# Altium footprint library RPSLib_orignal.PcbLib: 199 footprints (part 13 of 13)
Each footprint in its own frame and in the unit in brackets; x right, y up, seen from the top. Pads: shape width x height; smd on the part's side, far side on the other; paste and mask are expansions set on the pad; w line width, h text height; cw(c..) or ccw(c..) is an arc to the next point about the centre after c.
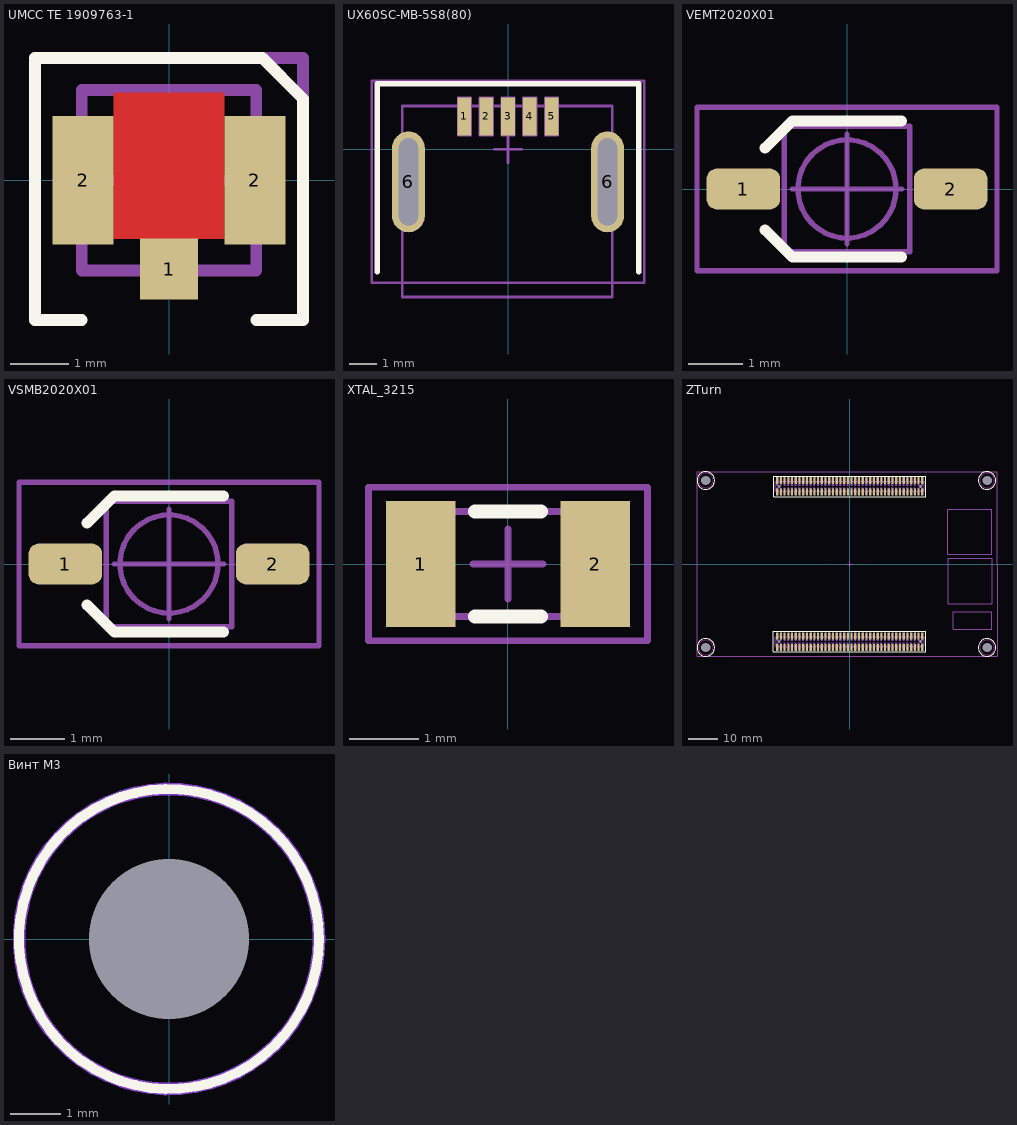
[diagram p12: the footprints below, top view; thin cyan lines are the x and y axes]

## UMCC TE 1909763-1 [mm]
height 1.25
pads (3):
  rect 1x1.05 smd mask+0.07: 1(0,-1.525)
  rect 1.05x2.2 smd mask+0.07: 2(-1.475,0) 2(1.475,0)
Top Layer:
  pour cut-out: -0.95,-1 -0.95,1.5 0.95,1.5 0.95,-1
Top Overlay:
  lines w0.2: -1.5,-2.4 -2.3,-2.4 -2.3,2.1 1.6,2.1 2.3,1.4 2.3,-2.4 1.5,-2.4
Mechanical 13:
  lines w0.2: -1.5,-1.55 -1.5,1.55 1.5,1.55 1.5,-1.55 -1.5,-1.55
Mechanical 15:
  lines w0.2: -2.3,-2.4 -2.3,2.1 2.3,2.1 2.3,-2.4 ; -1,0 1,0 ; 0,-1 0,1
3D body "С-1909763-1.stp": height 1.23, standoff 0, extent -1.5,-1.55 1.5,1.55

## UX60SC-MB-5S8(80) [mm]
height 4
pads (7):
  rect 0.5x1.4 smd mask+0.07: 1(-1.6,1.2) 2(-0.8,1.2) 3(0,1.2) 4(0.8,1.2) 5(1.6,1.2)
  oval 1.2x3.7 hole 0.7 slot 3.2 at 90 deg mask+0.07: 6(-3.65,-1.2) 6(3.65,-1.2)
Top Overlay:
  lines w0.2: -4.8,-4.5 -4.8,2.4 4.8,2.4 4.8,-4.5
Mechanical 1:
  lines w0.05: -3.897,-2.697 -3.403,0.297 ; -3.897,0.297 -3.403,-2.697 ; 3.403,-2.697 3.897,0.297 ; 3.403,0.297 3.897,-2.697 ; -1.85,0.5 -1.35,0.5 ; -1.85,0.5 -1.85,1.9 ; -1.85,0.5 -1.35,1.9 ; -1.85,1.9 -1.35,1.9 ; -1.85,1.9 -1.35,0.5 ; -1.35,0.5 -1.35,1.9 ; -1.05,0.5 -0.55,0.5 ; -1.05,0.5 -1.05,1.9 ; -1.05,0.5 -0.55,1.9 ; -1.05,1.9 -0.55,1.9 ; -1.05,1.9 -0.55,0.5 ; -0.55,0.5 -0.55,1.9 ; -0.25,0.5 0.25,0.5 ; -0.25,0.5 -0.25,1.9 ; -0.25,0.5 0.25,1.9 ; -0.25,1.9 0.25,1.9 ; -0.25,1.9 0.25,0.5 ; 0.25,0.5 0.25,1.9 ; 0.55,0.5 1.05,0.5 ; 0.55,0.5 0.55,1.9 ; 0.55,0.5 1.05,1.9 ; 0.55,1.9 1.05,1.9 ; 0.55,1.9 1.05,0.5 ; 1.05,0.5 1.05,1.9 ; 1.35,0.5 1.85,0.5 ; 1.35,0.5 1.35,1.9 ; 1.35,0.5 1.85,1.9 ; 1.35,1.9 1.85,1.9 ; 1.35,1.9 1.85,0.5 ; 1.85,0.5 1.85,1.9 ; -4,-2.45 ccw(c-3.65,-2.45) -3.65,-2.8 ccw(c-3.65,-2.45) -3.3,-2.45 -3.3,0.05 ccw(c-3.65,0.05) -3.65,0.4 ccw(c-3.65,0.05) -4,0.05 -4,-2.45 ; 3.3,-2.45 ccw(c3.65,-2.45) 3.65,-2.8 ccw(c3.65,-2.45) 4,-2.45 4,0.05 ccw(c3.65,0.05) 3.65,0.4 ccw(c3.65,0.05) 3.3,0.05 3.3,-2.45
Mechanical 13:
  lines w0.1: -3.875,-5.421 3.825,-5.421 3.825,1.579 -3.875,1.579 -3.875,-5.421
Mechanical 15:
  lines w0.1: -0.5,0 0.5,0 ; 0,-0.5 0,0.5 ; -5,-4.9 5,-4.9 5,2.5 -5,2.5 -5,-4.9
3D body "UX60SC-MB-5S8.stp": height 3.9, standoff -0.8, extent -3.875,-5.421 3.825,1.579

## VEMT2020X01 [mm] "Phototransistor 2.3x2.3, 2.8 height"
height 2.8
pads (2):
  rrect50% 1.35x0.75 smd mask+0.07: 1(-1.9,0) 2(1.9,0)
Top Overlay:
  lines w0.2: -1.5,-0.75 -1,-1.25 1,-1.25 ; -1.5,0.75 -1,1.25 1,1.25
Mechanical 13:
  circle w0.1: c0,0 r0.9
  lines w0.1: -1.15,-1.15 1.15,-1.15 1.15,1.15 -1.15,1.15 -1.15,-1.15
Mechanical 15:
  lines w0.1: -1,0 1,0 ; 0,-1 0,1 ; -2.75,-1.5 -2.75,1.5 2.75,1.5 2.75,-1.5 -2.75,-1.5
3D body "VEMT2020X01.step": height 2.77, standoff 0.05, extent -2.1,-1.15 2.1,1.15

## VSMB2020X01 [mm] "IR LED 2.3x2.3, 2.8 height"
height 2.8
pads (2):
  rrect50% 1.35x0.75 smd mask+0.07: 1(-1.9,0) 2(1.9,0)
Top Overlay:
  lines w0.2: -1.5,-0.75 -1,-1.25 1,-1.25 ; -1.5,0.75 -1,1.25 1,1.25
Mechanical 13:
  circle w0.1: c0,0 r0.9
  lines w0.1: -1.15,-1.15 -1.15,1.15 1.15,1.15 1.15,-1.15 -1.15,-1.15
Mechanical 15:
  lines w0.1: -1,0 1,0 ; 0,-1 0,1 ; -2.75,-1.5 2.75,-1.5 2.75,1.5 -2.75,1.5 -2.75,-1.5
3D body "VEMT2020X01.step": height 2.77, standoff 0.05, extent -2.1,-1.15 2.1,1.15

## XTAL_3215 [mm]
pads (2):
  rect 1x1.8 smd: 1(-1.25,0) 2(1.25,0)
Top Overlay:
  lines w0.2: -0.475,-0.75 0.475,-0.75 ; -0.475,0.75 0.475,0.75
Mechanical 3:
  lines w0.1: -1.6,-0.55 cw(c-1.6,-0.75) -1.4,-0.75 1.4,-0.75 cw(c1.6,-0.75) 1.6,-0.55 1.6,0.55 cw(c1.6,0.75) 1.4,0.75 -1.4,0.75 cw(c-1.6,0.75) -1.6,0.55 -1.6,-0.55
Mechanical 15:
  lines w0.1: -0.5,0 0.5,0 ; 0,-0.5 0,0.5 ; -2,-1.1 2,-1.1 2,1.1 -2,1.1 -2,-1.1
3D body "User Library-Siward_SX3215.step": height 0.81, standoff 0, extent -1.6,-0.75 1.6,0.75
3D body: height 0.81, standoff 0.15, extent -1.2,-0.6 1.2,0.6

## ZTurn [mm]
pads (168):
  rect 0.75x2.4 smd mask+0.07: A1(-24.765,-24.55) A2(-24.765,-28.45) A3(-23.495,-24.55) A4(-23.495,-28.45) A5(-22.225,-24.55) A6(-22.225,-28.45) A7(-20.955,-24.55) A8(-20.955,-28.45) A9(-19.685,-24.55) A10(-19.685,-28.45) A11(-18.415,-24.55) A12(-18.415,-28.45) A13(-17.145,-24.55) A14(-17.145,-28.45) A15(-15.875,-24.55) A16(-15.875,-28.45) A17(-14.605,-24.55) A18(-14.605,-28.45) A19(-13.335,-24.55) A20(-13.335,-28.45) A21(-12.065,-24.55) A22(-12.065,-28.45) A23(-10.795,-24.55) A24(-10.795,-28.45) A25(-9.525,-24.55) A26(-9.525,-28.45) A27(-8.255,-24.55) A28(-8.255,-28.45) A29(-6.985,-24.55) A30(-6.985,-28.45) A31(-5.715,-24.55) A32(-5.715,-28.45) A33(-4.445,-24.55) A34(-4.445,-28.45) A35(-3.175,-24.55) A36(-3.175,-28.45) A37(-1.905,-24.55) A38(-1.905,-28.45) A39(-0.635,-24.55) A40(-0.635,-28.45) A41(0.635,-24.55) A42(0.635,-28.45) A43(1.905,-24.55) A44(1.905,-28.45) A45(3.175,-24.55) A46(3.175,-28.45) A47(4.445,-24.55) A48(4.445,-28.45) A49(5.715,-24.55) A50(5.715,-28.45) A51(6.985,-24.55) A52(6.985,-28.45) A53(8.255,-24.55) A54(8.255,-28.45) A55(9.525,-24.55) A56(9.525,-28.45) A57(10.795,-24.55) A58(10.795,-28.45) A59(12.065,-24.55) A60(12.065,-28.45) A61(13.335,-24.55) A62(13.335,-28.45) A63(14.605,-24.55) A64(14.605,-28.45) A65(15.875,-24.55) A66(15.875,-28.45) A67(17.145,-24.55) A68(17.145,-28.45) A69(18.415,-24.55) A70(18.415,-28.45) A71(19.685,-24.55) A72(19.685,-28.45) A73(20.955,-24.55) A74(20.955,-28.45) A75(22.225,-24.55) A76(22.225,-28.45) A77(23.495,-24.55) A78(23.495,-28.45) A79(24.765,-24.55) A80(24.765,-28.45) B1(-24.765,28.45) B2(-24.765,24.55) B3(-23.495,28.45) B4(-23.495,24.55) B5(-22.225,28.45) B6(-22.225,24.55) B7(-20.955,28.45) B8(-20.955,24.55) B9(-19.685,28.45) B10(-19.685,24.55) B11(-18.415,28.45) B12(-18.415,24.55) B13(-17.145,28.45) B14(-17.145,24.55) B15(-15.875,28.45) B16(-15.875,24.55) B17(-14.605,28.45) B18(-14.605,24.55) B19(-13.335,28.45) B20(-13.335,24.55) B21(-12.065,28.45) B22(-12.065,24.55) B23(-10.795,28.45) B24(-10.795,24.55) B25(-9.525,28.45) B26(-9.525,24.55) B27(-8.255,28.45) B28(-8.255,24.55) B29(-6.985,28.45) B30(-6.985,24.55) B31(-5.715,28.45) B32(-5.715,24.55) B33(-4.445,28.45) B34(-4.445,24.55) B35(-3.175,28.45) B36(-3.175,24.55) B37(-1.905,28.45) B38(-1.905,24.55) B39(-0.635,28.45) B40(-0.635,24.55) B41(0.635,28.45) B42(0.635,24.55) B43(1.905,28.45) B44(1.905,24.55) B45(3.175,28.45) B46(3.175,24.55) B47(4.445,28.45) B48(4.445,24.55) B49(5.715,28.45) B50(5.715,24.55) B51(6.985,28.45) B52(6.985,24.55) B53(8.255,28.45) B54(8.255,24.55) B55(9.525,28.45) B56(9.525,24.55) B57(10.795,28.45) B58(10.795,24.55) B59(12.065,28.45) B60(12.065,24.55) B61(13.335,28.45) B62(13.335,24.55) B63(14.605,28.45) B64(14.605,24.55) B65(15.875,28.45) B66(15.875,24.55) B67(17.145,28.45) B68(17.145,24.55) B69(18.415,28.45) B70(18.415,24.55) B71(19.685,28.45) B72(19.685,24.55) B73(20.955,28.45) B74(20.955,24.55) B75(22.225,28.45) B76(22.225,24.55) B77(23.495,28.45) B78(23.495,24.55) B79(24.765,28.45) B80(24.765,24.55)
  round 0 hole 1 unplated mask+0.07: mh0(-24.13,-26.5) MH0(-24.13,26.5) MH0(24.13,-26.5) MH0(24.13,26.5)
  round 0 hole 3.2 unplated mask+0.07: mh1(-49.13,28.5) mh2(-49.13,-28.5) mh3(46.87,28.5) mh4(46.87,-28.5)
Top Overlay:
  circle w0.2: c46.87,-28.5 r3
  circle w0.2: c46.87,28.5 r3
  circle w0.2: c-49.13,28.5 r3
  circle w0.2: c-49.13,-28.5 r3
  lines w0.2: -26.044,-29.976 -26.044,-22.976 25.956,-22.976 25.956,-29.976 -26.044,-29.976 ; -26,23 -26,30 26,30 26,23 -26,23
Keep-Out Layer:
  circle w0.254: c46.87,-28.5 r2.5
  circle w0.254: c46.87,28.5 r2.5
  circle w0.254: c-49.13,28.5 r2.5
  circle w0.254: c-49.13,-28.5 r2.5
Mechanical 13:
  drawing of 1616 lines, arcs and shapes, not listed
  text "Ehternet" at 47.631,7.957 h2
  text "HDMI" at 47.743,-7.633 h2
  text "PWR" at 47.985,-21.256 h2
Mechanical 15:
  lines w0.1: -1,0 1,0 ; 0,-1 0,1 ; -52.13,-31.5 50.25,-31.5 50.25,31.5 -52.13,31.5 -52.13,-31.5
3D body "20021121-00080T4LF_ZTurn.stp": height 22.23, standoff -1, extent -52.13,-31.5 50.154,31.5

## Винт М3 [mm]
pads (1):
  round 0 hole 3.2 unplated mask+0.07: mh2(0,0)
Top Layer keep-out:
  circle w0.254: c0,0 r3
Bottom Layer keep-out:
  circle w0.254: c0,0 r3
Top Overlay:
  circle w0.2: c0,0 r3
Mechanical 15:
  circle w0.1: c0,0 r3
  lines w0.2: -1.25,0 1.25,0 ; 0,-1.25 0,1.25